# Altium integrated library SubjuGator8.IntLib: 306 symbols (part 2 of 2) (continued)
## MC78M12CDTG (continued)

## MC78M15CDTRKG
designator U?
15V 500 mA Positive Voltage Regulator; Supplier 1: Digi-Key; Supplier Part Number 1: MC78M15CDTRKGOSCT-ND
footprint MC78M00
pins: 1 VDD (power), 3 VOUT (power), 4 GND (power)

## MCP6L01
designator U?  (value not drawn)
Op Amp Rail-to-Rail 1Mhz; Supplier 1: Digi-Key; Supplier Part Number 1: MCP6L01T-E/OTCT-ND
footprint MCP6L01R (SOT23, 5-Leads, Body 2.90x2.70mm, Pitch 0.95mm, IPC Medium Density)
pins: 1 VOUT (out), 2 VSS (power), 3 VIN+ (in), 4 VIN- (in), 5 VDD (power)

## MCP6L02
designator U?
IC OPAMP GP 1MHZ RRO 8SOIC; Supplier 1: Digi-Key; Supplier Part Number 1: MCP6L02T-E/SNCT-ND
footprint 8-SOIC (Used for LMH6612)
footprint 8-SOIC (Used for LMH6612)
pins: 1 VoutA, 2 VinA-, 3 VinA+, 4 Vss, 5 VinB+, 6 VinB-, 7 VoutB, 8 Vdd

## MCP6L04
designator U?  (value not drawn)
Quad Op Amp Rail-to-Rail 1Mhz; Supplier 1: Digi-Key
footprint MCP6L04T-E/SL (IC OPAMP GP 1MHZ RRO 14SOIC)
part A pins: 1 VOUTA, 2 VINA-, 3 VINA+, 4 VDD, 11 VSS
part B pins: 5 VINB+, 6 VINB-, 7 VOUTB
part C pins: 8 VOUTC, 9 VINC-, 10 VINC+
part D pins: 12 VIND+, 13 VIND-, 14 VOUTD

## MCP970x
designator U?, comment MCP9701
Low-Power Linear Active Thermistor ICs; Supplier 1: Digi-Key; Supplier Part Number 1: MCP9701A-E/TO-ND
footprint MCP970x-E/TO (Low-Power Linear Active Thermistor ICs)
footprint MCP970X-E/TT (SOT23, 3-Leads, Body 2.86x2.37mm, Pitch 0.95mm, IPC Medium Density)
pins: 1 VDD (power), 2 VOUT (out), 3 GND (power)

## MCP1407-E/SN
designator U?  (value not drawn)
6A High speed MOSFET driver low side; Supplier 1: Digi-Key; Supplier Part Number 1: MCP1407-E/SN-ND
footprint MCP1407-E/SN (Low side FET driver)
pins: 1 VDD, 2 INPUT (in), 3 NC, 4 GND, 5 GND, 6 OUT (out), 7 OUT (out), 8 VDD

## MCP1700T-1802E/TT
designator U?, comment MCP1700T
IC REG LDO 1.8V 0.2A SOT23-3; Supplier 1: Digi-Key; Supplier Part Number 1: MCP1700T1802ETTCT-ND
footprint SOT23-3 (For 1.8V LDO)
pins: 1 GND, 2 Vout, 3 Vin

## MCP1703AT
designator U?
250 mA, 16V, Low Quiescent Current LDO Regulator; Supplier 1: Digi-Key; Supplier Part Number 1: MCP1703AT-3302E/CBCT-ND
footprint MCP1703AT-xx02EDB (SOT23, 3-Leads, Body 2.90x2.55mm, Pitch 0.95mm, IPC Medium Density)
pins: 1 GND (power), 2 VOUT, 3 VIN

## MCP2210-I/SO
designator U?
IC CONVERTER USB-SPI 20-SOIC; Manufacturer 1: Microchip; ComponentLink1Description: Datasheet; ComponentLink1URL: http://ww1.microchip.com/downloads/en/DeviceDoc/22288A.pdf; ComponentLink2Description: Website; ComponentLink2URL: http://www.microchip.com/wwwproducts/en/MCP2210; Supplier 1: Digi-Key; Supplier Part Number 1: MCP2210-I/SO-ND; Manufacturer Part Number 1: MCP2210-I/SO
footprint MCP2210-I/SO (IC CONVERTER USB-SPI 20-SOIC)
pins: 1 Vdd, 2 OSC1, 3 OSC2, 4 ~{RST}, 5 GP0, 6 GP1, 7 GP2, 8 GP3, 9 MOSI, 10 GP4, 11 SCK, 12 GP5, 13 MISO, 14 GP6, 15 GP7, 16 GP8, 17 Vusb, 18 Dminus, 19 Dplus, 20 Vss

## MCP2515
designator U?
IC CAN CONTROLLER W/SPI 18SOIC; Manufacturer 1: Microchip; Manufacturer Part Number 1: MCP2515T-I/SO; ComponentLink1URL: http://ww1.microchip.com/downloads/en/DeviceDoc/20001801H.pdf; ComponentLink1Description: Datasheet; ComponentLink2URL: https://www.microchip.com/wwwproducts/en/en010406; ComponentLink2Description: Website
footprint MCP2515T-I/SO (IC CAN CONTROLLER W/SPI 18SOIC)
pins: 1 TXCAN, 2 RXCAN, 3 CLKOUT, 4 ~{TX0RTS}, 5 ~{TX1RTS}, 6 ~{TX2RTS}, 7 OSC2, 8 OSC1, 9 VSS, 10 ~{RX0BF}, 11 ~{RX1BF}, 12 ~{INT}, 13 SCK, 14 SI, 15 SO, 16 ~{CS}, 17 ~{RESET}, 18 VDD

## MCP3208
designator U?
IC ADC 12BIT 2.7V 8CH SPI 16SOIC; Supplier 1: Digi-Key; Supplier Part Number 1: MCP3208-CI/SL-ND
footprint MCP3208-CI/SL (IC ADC 12BIT 2.7V 8CH SPI 16SOIC)
pins: 1 CH0, 2 CH1, 3 CH2, 4 CH3, 5 CH4, 6 CH5, 7 CH6, 8 CH7, 9 DGND, 10 CSSHDN, 11 DIN, 12 DOUT, 13 CLK, 14 AGND, 15 VREF, 16 VDD

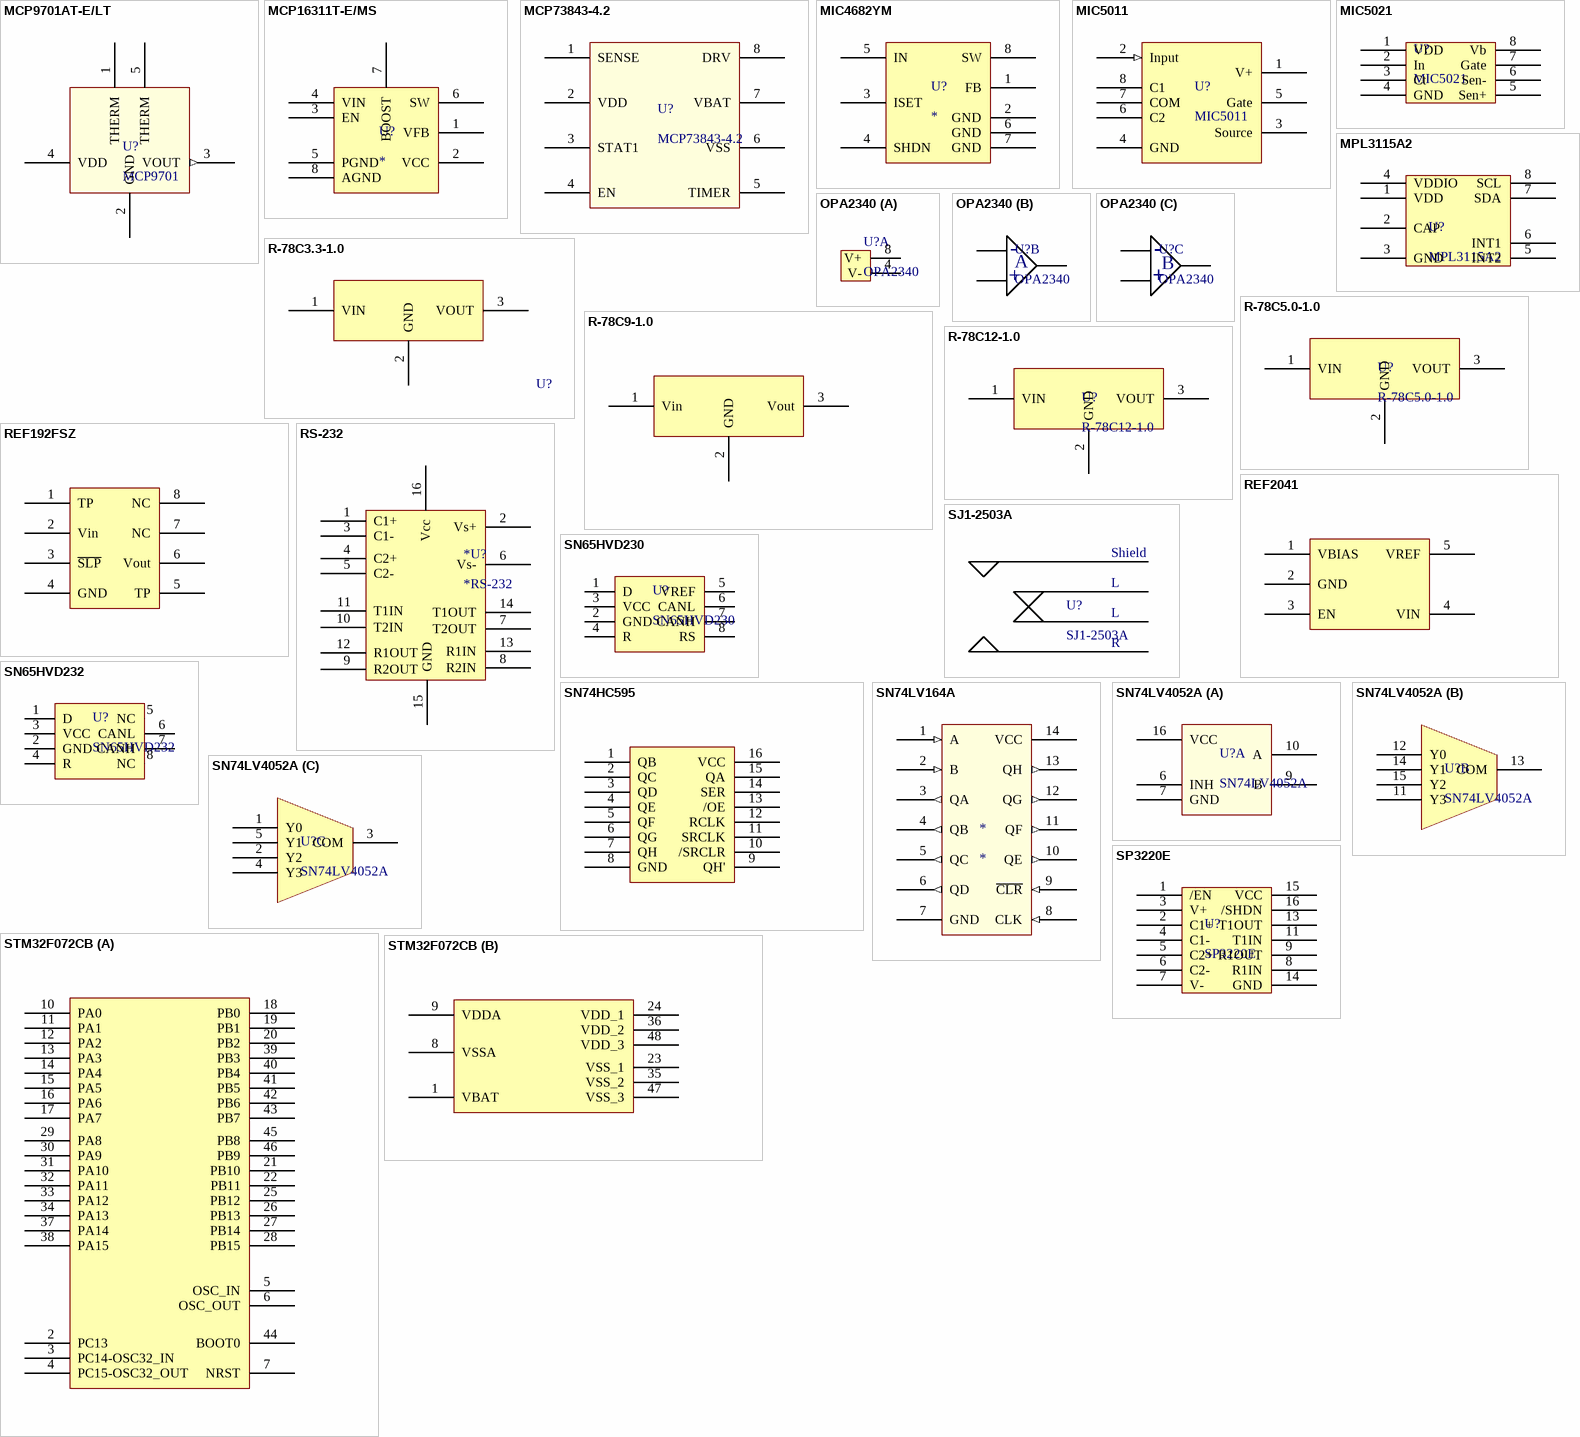
[diagram p8: symbols MCP9701AT-E/LT to STM32F072CB]

## MCP9701AT-E/LT
designator U?, comment MCP9701
Low-Power Linear Active Thermistor ICs; Supplier 1: Digi-Key; Supplier Part Number 1: MCP9701AT-E/LTCT-ND
footprint MCP9701AT-E/LT (SOT23, 5-Leads, Body 2.3x2.4mm (max), Pitch 0.65mm, IPC Medium Density)
pins: 1 THERM, 2 GND (power), 3 VOUT (out), 4 VDD (power), 5 THERM

## MCP16311T-E/MS
designator U?
IC REG BUCK ADJ 1A SYNC 8MSOP; Supplier Part Number 1: MCP16311T-E/MSCT-ND; Supplier 1: Digi-Key
footprint TSSOP-8 (TSOP, 8-Leads, Body 3.00x3.00mm, Pitch 0.65mm, IPC Medium Density)
pins: 1 VFB, 2 VCC, 3 EN, 4 VIN, 5 PGND, 6 SW, 7 BOOST, 8 AGND

## MCP73843-4.2
designator U?
IC CONTROLLER LI-ION 4.2V 8MSOP; Manufacturer 1: Microchip Technology; Manufacturer Part Number 1: MCP73843-420I/MS; Supplier 1: Digi-Key; Supplier Part Number 1: MCP73843-420I/MS-ND
footprint MSOP-8N (LT1767)
pins: 1 SENSE, 2 VDD, 3 STAT1, 4 EN, 5 TIMER, 6 VSS, 7 VBAT, 8 DRV

## MIC4682YM
designator U?
IC REG BUCK ADJ 2A 8SOIC; Supplier Part Number 1: 576-1802-5-ND; Supplier 1: Digi-Key
footprint 8-SOIC (Used for LMH6612)
pins: 1 FB, 2 GND, 3 ISET, 4 SHDN, 5 IN, 6 GND, 7 GND, 8 SW

## MIC5011
designator U?
Minimum Parts High- or Low-Side MOSFET Driver; Supplier 1: Digi-Key; Supplier Part Number 1: 576-1230-ND
footprint MIC5011 (SOIC, 8-Leads, Body 4.90x3.90mm, Pitch 1.27mm, IPC Medium Density)
pins: 1 V+ (power), 2 Input (in), 3 Source, 4 GND (power), 5 Gate, 6 C2, 7 COM, 8 C1

## MIC5021
designator U?
IC DRIVER MOSFET HISIDE HS 8SOIC; Supplier 1: Digi-Key; Supplier Part Number 1: 576-1239-1-ND
footprint MIC5021 (SOIC, 8-Leads, Body 4.90x3.90mm, Pitch 1.27mm, IPC Medium Density)
pins: 1 VDD, 2 In, 3 Ct, 4 GND, 5 Sen+, 6 Sen-, 7 Gate, 8 Vb

## MPL3115A2
designator U?
IC ALTIMETER I2C VERSION 8LGA; Supplier 1: Digi-Key; Supplier Part Number 1: MPL3115A2R1CT-ND
footprint MPL3115A2 (LGA, 8-Leads, Body 2.65x4.65mmx1.20mm, Pitch 1.00mm)
pins: 1 VDD, 2 CAP, 3 GND, 4 VDDIO, 5 INT2, 6 INT1, 7 SDA, 8 SCL

## OPA2340
designator U?
IC OPAMP GP 5.5MHZ RRO 8SOIC; Supplier 1: Digi-Key; Supplier Part Number 1: 296-26254-1-ND
footprint OPA2340 (SOIC, 8-Leads, Body 4.90x3.90mm, Pitch 1.27mm, IPC Medium Density)
part A pins: 4 V-, 8 V+
part B pins: 1 AOut, 2 AIn-, 3 AIn+
part C pins: 5 BIn+, 6 BIn-, 7 BOut
part B text: -; A; +
part C text: -; B; +

## R-78C3.3-1.0
designator U?  (value not drawn)
CONV DC/DC 1A 3.3V OUT SIP VERT; Supplier 1: Digi-Key; Supplier Part Number 1: 945-1394-5-ND
footprint R-78C3.3-1.0 (CONV DC/DC 1A 3.3V OUT SIP VERT)
pins: 1 VIN, 2 GND (power), 3 VOUT

## R-78C5.0-1.0
designator U?
CONV DC/DC 1A 5V OUT SIP VERT; Supplier 1: Digi-Key; Supplier Part Number 1: 945-1395-5-ND
footprint R-78C5.0-1.0 (CONV DC/DC 1A 5V OUT SIP VERT)
pins: 1 VIN, 2 GND (power), 3 VOUT

## R-78C9-1.0
designator U?, comment R-78C9.0-1.0
945-1396-5-ND; Supplier 1: Digi-Key; Supplier Part Number 1: 945-1396-5-ND
footprint R-78C12-1.0 (CONV DC/DC 1A 12V OUT SIP VERT)
pins: 1 Vin, 2 GND, 3 Vout

## R-78C12-1.0
designator U?
CONV DC/DC 1A 12V OUT SIP VERT; Supplier 1: Digi-Key; Supplier Part Number 1: 945-1392-5-ND
footprint R-78C12-1.0 (CONV DC/DC 1A 12V OUT SIP VERT)
pins: 1 VIN, 2 GND (power), 3 VOUT

## REF192FSZ
designator U?, comment 2.5V Ref
IC VREF SERIES 2.5V 8SOIC; Supplier 1: Digi-Key; Supplier Part Number 1: REF192FSZ-ND
footprint SOIC2.5-8n (For 2.5V ref IC)
pins: 1 TP, 2 Vin, 3 ~{SLP}, 4 GND, 5 TP, 6 Vout, 7 NC, 8 NC

## REF2041
designator U?
IC VREF SERIES 2.05V/4.096V 5SOT; Supplier 1: Digi-Key; Supplier Part Number 1: 296-38497-1-ND
footprint SOT23-5 (Used for LP2992)
pins: 1 VBIAS, 2 GND, 3 EN, 4 VIN, 5 VREF

## RS-232
designator *U?, comment *RS-232
IC DVR/RCVR RS232 DUAL 16SOIC; Manufacturer 1: *Texas Instruments; Supplier 1: *Digi-Key; Supplier Part Number 1: *296-25009-1-ND; Manufacturer Part Number 1: *RS-232; ComponentLink1URL: *http://www.ti.com/lit/ds/symlink/trs232.pdf; ComponentLink1URL: *; ComponentLinkURL: *; ComponentLink1URL: asdfsdaf; ComponentLink1Description: Datasheet; ComponentLink1URL: http://www.ti.com/lit/ds/symlink/trs232.pdf; ComponentLink2Description: Website; ComponentLink2URL: https://www.digikey.com/product-detail/en/texas-instruments/TRS232DR/296-25009-1-ND/2136546
footprint RS-232 (IC DVR/RCVR RS232 DUAL 16SOIC)
pins: 1 C1+, 2 Vs+, 3 C1-, 4 C2+, 5 C2-, 6 Vs-, 7 T2OUT, 8 R2IN, 9 R2OUT, 10 T2IN, 11 T1IN, 12 R1OUT, 13 R1IN, 14 T1OUT, 15 GND, 16 Vcc

## SJ1-2503A
designator U?
CONN JACK STEREO 2.5MM R/A; Supplier 1: Digi-Key; Supplier Part Number 1: CP1-2503A-ND
footprint Stereo_Jack_3.5
pins: 1 Shield, 2 L1, 3 L2, 4 R
text: L

## SN65HVD230
designator U?
3.3V CAN Bus Transceiver
footprint SOIC-8pin (For 296-1345-1-ND)
pins: 1 D, 2 GND, 3 VCC, 4 R, 5 VREF, 6 CANL, 7 CANH, 8 RS

## SN65HVD232
designator U?
3.3V CAN Bus Transceiver
footprint SOIC-8pin (For 296-1345-1-ND)
pins: 1 D, 2 GND, 3 VCC, 4 R, 5 NC, 6 CANL, 7 CANH, 8 NC

## SN74HC595
designator U?
IC 8BIT SHIFT REG 3ST-OUT 16SOIC; Supplier 1: Digi-Key; Supplier Part Number 1: 296-14858-1-ND
footprint TSSOP-16pin (For 296-19764-ND)
pins: 1 QB, 2 QC, 3 QD, 4 QE, 5 QF, 6 QG, 7 QH, 8 GND, 9 QH', 10 /SRCLR, 11 SRCLK, 12 RCLK, 13 /OE, 14 SER, 15 QA, 16 VCC

## SN74LV164A
designator *
8-Bit Parallel out Serial Shift Register; Supplier 1: Digi-Key; Supplier Part Number 1: 296-1680-5-ND
footprint SN74LV164AD (SOIC, 14-Leads, Body 8.65x3.90mm, Pitch 1.27mm, IPC Medium Density)
pins: 1 A (in), 2 B (in), 3 QA (out), 4 QB (out), 5 QC (out), 6 QD (out), 7 GND (power), 8 CLK (in), 9 ~{CLR} (in), 10 QE (out), 11 QF (out), 12 QG (out), 13 QH (out), 14 VCC (power)

## SN74LV4052A
designator U?
Dual 4-Channel Analog Multiplexers/Demultiplexers; Supplier 1: Digi-Key; Supplier Part Number 1: 296-16707-1-ND
footprint SN74LV4052AD (SOIC, 16-Leads, Body 10.0x4.0mm (max), Pitch 1.27mm, IPC Medium Density)
part A pins: 6 INH, 7 GND, 9 B, 10 A, 16 VCC (power)
part B pins: 11 Y3, 12 Y0, 13 COM, 14 Y1, 15 Y2
part C pins: 1 Y0, 2 Y2, 3 COM, 4 Y3, 5 Y1

## SP3220E
designator U?
IC DVR/RCVR RS232 ESD 16TSSOP; Supplier 1: Digi-Key; Supplier Part Number 1: 1016-1920-1-ND
footprint SP3220ECY-L/TR (TSOP, 16-Leads, Body 5.00x4.40mm, Pitch 0.65mm, IPC Medium Density)
pins: 1 /EN, 2 C1+, 3 V+, 4 C1-, 5 C2+, 6 C2-, 7 V-, 8 R1IN, 9 R1OUT, 11 T1IN, 13 T1OUT, 14 GND, 15 VCC, 16 /SHDN

## STM32F072CB
designator U?
MCU 32BIT 128KB FLASH 48LQFP; Supplier 1: Digi-Key; Supplier Part Number 1: 497-14645-ND
footprint STM32F072CB (TSQFP, 48-Leads, Body 7.00x7.00mm, Pitch 0.50mm, IPC Medium Density)
part A pins: 2 PC13, 3 PC14-OSC32_IN, 4 PC15-OSC32_OUT, 5 OSC_IN, 6 OSC_OUT, 7 NRST, 10 PA0, 11 PA1, 12 PA2, 13 PA3, 14 PA4, 15 PA5, 16 PA6, 17 PA7, 18 PB0, 19 PB1, 20 PB2, 21 PB10, 22 PB11, 25 PB12, 26 PB13, 27 PB14, 28 PB15, 29 PA8, 30 PA9, 31 PA10, 32 PA11, 33 PA12, 34 PA13, 37 PA14, 38 PA15, 39 PB3, 40 PB4, 41 PB5, 42 PB6, 43 PB7, 44 BOOT0, 45 PB8, 46 PB9
part B pins: 1 VBAT, 8 VSSA, 9 VDDA, 23 VSS_1, 24 VDD_1, 35 VSS_2, 36 VDD_2, 47 VSS_3, 48 VDD_3

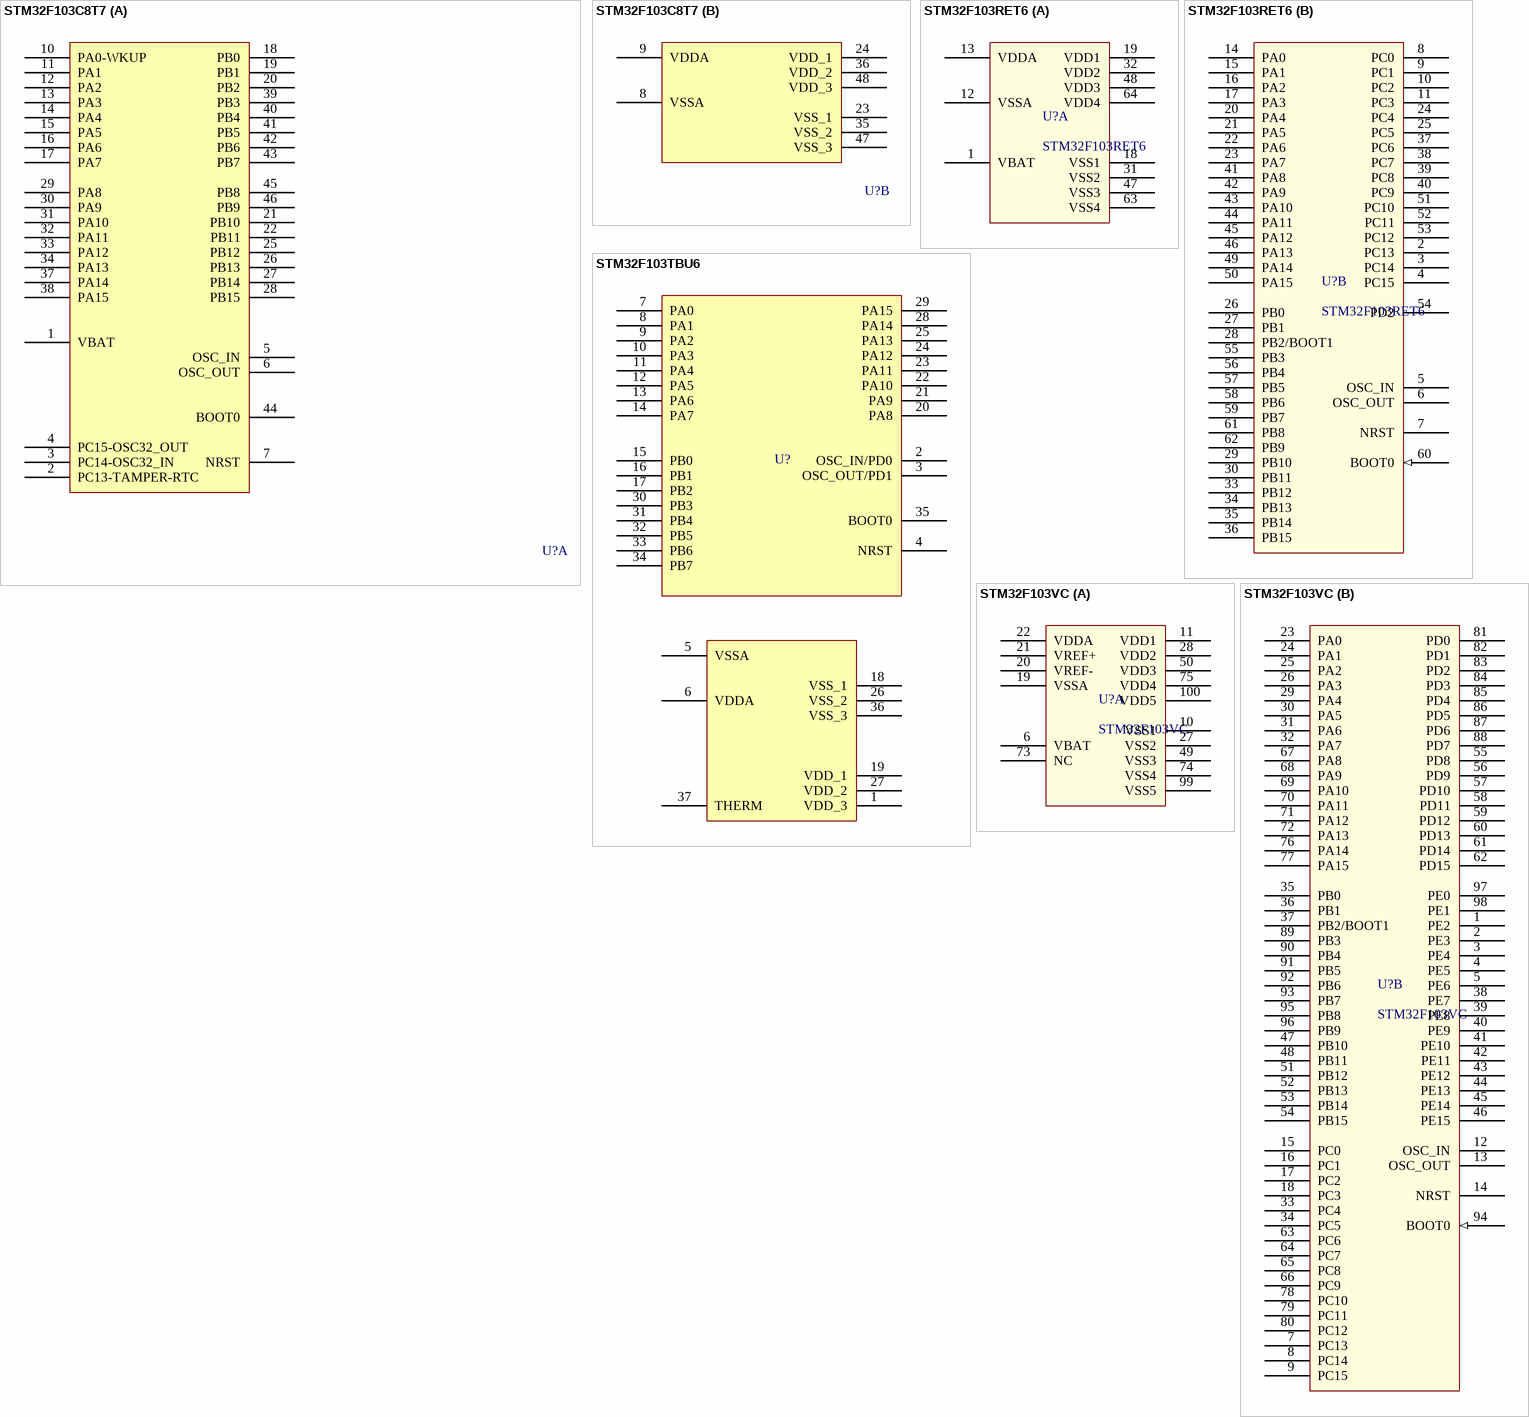
[diagram p9: symbols STM32F103C8T7 to STM32F103VC]

## STM32F103C8T7
designator U?  (value not drawn)
MCU ARM 32BIT 64K FLASH 48-LQFP; Supplier 1: Digi-Key; Supplier Part Number 1: 497-11517-ND
footprint STM32F103C8T7 (MCU ARM 32BIT 64K FLASH 48-LQFP)
part A pins: 1 VBAT, 2 PC13-TAMPER-RTC, 3 PC14-OSC32_IN, 4 PC15-OSC32_OUT, 5 OSC_IN, 6 OSC_OUT, 7 NRST, 10 PA0-WKUP, 11 PA1, 12 PA2, 13 PA3, 14 PA4, 15 PA5, 16 PA6, 17 PA7, 18 PB0, 19 PB1, 20 PB2, 21 PB10, 22 PB11, 25 PB12, 26 PB13, 27 PB14, 28 PB15, 29 PA8, 30 PA9, 31 PA10, 32 PA11, 33 PA12, 34 PA13, 37 PA14, 38 PA15, 39 PB3, 40 PB4, 41 PB5, 42 PB6, 43 PB7, 44 BOOT0, 45 PB8, 46 PB9
part B pins: 8 VSSA, 9 VDDA, 23 VSS_1, 24 VDD_1, 35 VSS_2, 36 VDD_2, 47 VSS_3, 48 VDD_3

## STM32F103RET6
designator U?
Mainstream Performance line, ARM Cortex-M3 MCU
footprint STM32F103RxTx (TSQFP, 64-Leads, Body 12.2x12.2mm (max), Pitch 0.50mm, IPC Medium Density)
part A pins: 1 VBAT (power), 12 VSSA (power), 13 VDDA (power), 18 VSS1 (power), 19 VDD1 (power), 31 VSS2 (power), 32 VDD2 (power), 47 VSS3 (power), 48 VDD3 (power), 63 VSS4 (power), 64 VDD4 (power)
part B pins: 2 PC13, 3 PC14, 4 PC15, 5 OSC_IN, 6 OSC_OUT, 7 NRST, 8 PC0, 9 PC1, 10 PC2, 11 PC3, 14 PA0, 15 PA1, 16 PA2, 17 PA3, 20 PA4, 21 PA5, 22 PA6, 23 PA7, 24 PC4, 25 PC5, 26 PB0, 27 PB1, 28 PB2/BOOT1, 29 PB10, 30 PB11, 33 PB12, 34 PB13, 35 PB14, 36 PB15, 37 PC6, 38 PC7, 39 PC8, 40 PC9, 41 PA8, 42 PA9, 43 PA10, 44 PA11, 45 PA12, 46 PA13, 49 PA14, 50 PA15, 51 PC10, 52 PC11, 53 PC12, 54 PD2, 55 PB3, 56 PB4, 57 PB5, 58 PB6, 59 PB7, 60 BOOT0 (in), 61 PB8, 62 PB9

## STM32F103TBU6
designator U?  (value not drawn)
MCU ARM 32BIT 32K FLASH 36VFQFP; Supplier 1: Digi-Key; Supplier Part Number 1: 497-11534-ND
footprint STM32F103TBU6 (MCU ARM 32BIT 128KB 36VFQFPN)
footprint STM32F103TBU6_NO_VIAS (MCU ARM 32BIT 128KB 36VFQFPN)
pins: 1 VDD_3, 2 OSC_IN/PD0, 3 OSC_OUT/PD1, 4 NRST, 5 VSSA, 6 VDDA, 7 PA0, 8 PA1, 9 PA2, 10 PA3, 11 PA4, 12 PA5, 13 PA6, 14 PA7, 15 PB0, 16 PB1, 17 PB2, 18 VSS_1, 19 VDD_1, 20 PA8, 21 PA9, 22 PA10, 23 PA11, 24 PA12, 25 PA13, 26 VSS_2, 27 VDD_2, 28 PA14, 29 PA15, 30 PB3, 31 PB4, 32 PB5, 33 PB6, 34 PB7, 35 BOOT0, 36 VSS_3, 37 THERM

## STM32F103VC
designator U?
Mainstream Performance line, ARM Cortex-M3 MCU; Supplier 1: Digi-Key; Supplier Part Number 1: 497-9034-ND
footprint STM32F103VC (STM32F103 LQFP100 package)
part A pins: 6 VBAT (power), 10 VSS1 (power), 11 VDD1 (power), 19 VSSA (power), 20 VREF- (power), 21 VREF+ (power), 22 VDDA (power), 27 VSS2 (power), 28 VDD2 (power), 49 VSS3 (power), 50 VDD3 (power), 73 NC (hiz), 74 VSS4 (power), 75 VDD4 (power), 99 VSS5 (power), 100 VDD5 (power)
part B pins: 1 PE2, 2 PE3, 3 PE4, 4 PE5, 5 PE6, 7 PC13, 8 PC14, 9 PC15, 12 OSC_IN, 13 OSC_OUT, 14 NRST, 15 PC0, 16 PC1, 17 PC2, 18 PC3, 23 PA0, 24 PA1, 25 PA2, 26 PA3, 29 PA4, 30 PA5, 31 PA6, 32 PA7, 33 PC4, 34 PC5, 35 PB0, 36 PB1, 37 PB2/BOOT1, 38 PE7, 39 PE8, 40 PE9, 41 PE10, 42 PE11, 43 PE12, 44 PE13, 45 PE14, 46 PE15, 47 PB10, 48 PB11, 51 PB12, 52 PB13, 53 PB14, 54 PB15, 55 PD8, 56 PD9, 57 PD10, 58 PD11, 59 PD12, 60 PD13, 61 PD14, 62 PD15, 63 PC6, 64 PC7, 65 PC8, 66 PC9, 67 PA8, 68 PA9, 69 PA10, 70 PA11, 71 PA12, 72 PA13, 76 PA14, 77 PA15, 78 PC10, 79 PC11, 80 PC12, 81 PD0, 82 PD1, 83 PD2, 84 PD3, 85 PD4, 86 PD5, 87 PD6, 88 PD7, 89 PB3, 90 PB4, 91 PB5, 92 PB6, 93 PB7, 94 BOOT0 (in), 95 PB8, 96 PB9, 97 PE0, 98 PE1

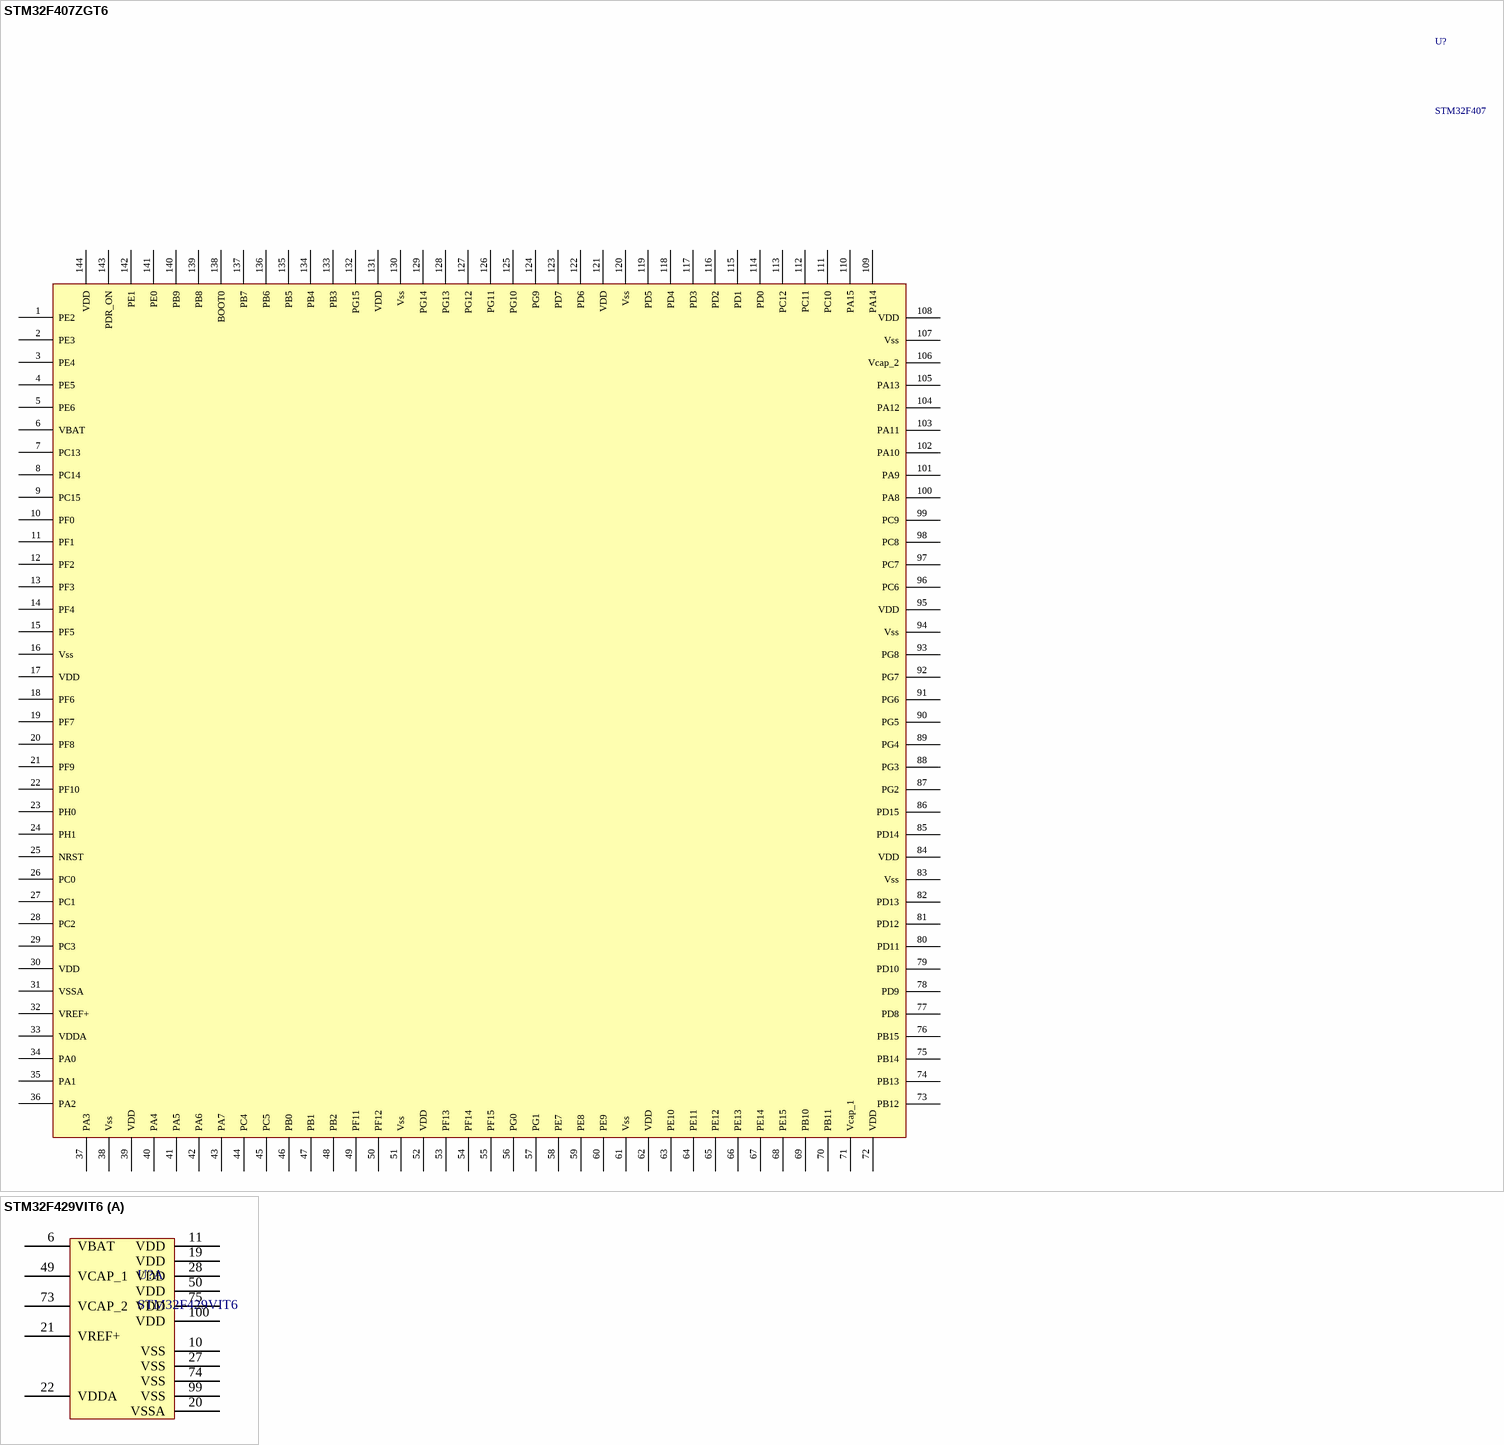
[diagram p10: symbols STM32F407ZGT6 to STM32F429VIT6]

## STM32F407ZGT6
designator U?, comment STM32F407
IC MCU 32BIT 1MB FLASH 144LQFP; Supplier 1: Digi-Key; Supplier Part Number 1: 497-11766-ND
footprint LQFP-144 (For STM32F407)
pins: 1 PE2, 2 PE3, 3 PE4, 4 PE5, 5 PE6, 6 VBAT, 7 PC13, 8 PC14, 9 PC15, 10 PF0, 11 PF1, 12 PF2, 13 PF3, 14 PF4, 15 PF5, 16 Vss, 17 VDD, 18 PF6, 19 PF7, 20 PF8, 21 PF9, 22 PF10, 23 PH0, 24 PH1, 25 NRST, 26 PC0, 27 PC1, 28 PC2, 29 PC3, 30 VDD, 31 VSSA, 32 VREF+, 33 VDDA, 34 PA0, 35 PA1, 36 PA2, 37 PA3, 38 Vss, 39 VDD, 40 PA4, 41 PA5, 42 PA6, 43 PA7, 44 PC4, 45 PC5, 46 PB0, 47 PB1, 48 PB2, 49 PF11, 50 PF12, 51 Vss, 52 VDD, 53 PF13, 54 PF14, 55 PF15, 56 PG0, 57 PG1, 58 PE7, 59 PE8, 60 PE9, 61 Vss, 62 VDD, 63 PE10, 64 PE11, 65 PE12, 66 PE13, 67 PE14, 68 PE15, 69 PB10, 70 PB11, 71 Vcap_1, 72 VDD, 73 PB12, 74 PB13, 75 PB14, 76 PB15, 77 PD8, 78 PD9, 79 PD10, 80 PD11, 81 PD12, 82 PD13, 83 Vss, 84 VDD, 85 PD14, 86 PD15, 87 PG2, 88 PG3, 89 PG4, 90 PG5, 91 PG6, 92 PG7, 93 PG8, 94 Vss, 95 VDD, 96 PC6, 97 PC7, 98 PC8, 99 PC9, 100 PA8, 101 PA9, 102 PA10, 103 PA11, 104 PA12, 105 PA13, 106 Vcap_2, 107 Vss, 108 VDD, 109 PA14, 110 PA15, 111 PC10, 112 PC11, 113 PC12, 114 PD0, 115 PD1, 116 PD2, 117 PD3, 118 PD4, 119 PD5, 120 Vss, 121 VDD, 122 PD6, 123 PD7, 124 PG9, 125 PG10, 126 PG11, 127 PG12, 128 PG13, 129 PG14, 130 Vss, 131 VDD, 132 PG15, 133 PB3, 134 PB4, 135 PB5, 136 PB6, 137 PB7, 138 BOOT0, 139 PB8, 140 PB9, 141 PE0, 142 PE1, 143 PDR_ON, 144 VDD
